# Altium footprint library ICL_komponenty_v1.PcbLib: 160 footprints (part 9 of 10)
Each footprint in its own frame and in the unit in brackets; x right, y up, seen from the top. Pads: shape width x height; smd on the part's side, far side on the other; paste and mask are expansions set on the pad; w line width, h text height; cw(c..) or ccw(c..) is an arc to the next point about the centre after c.
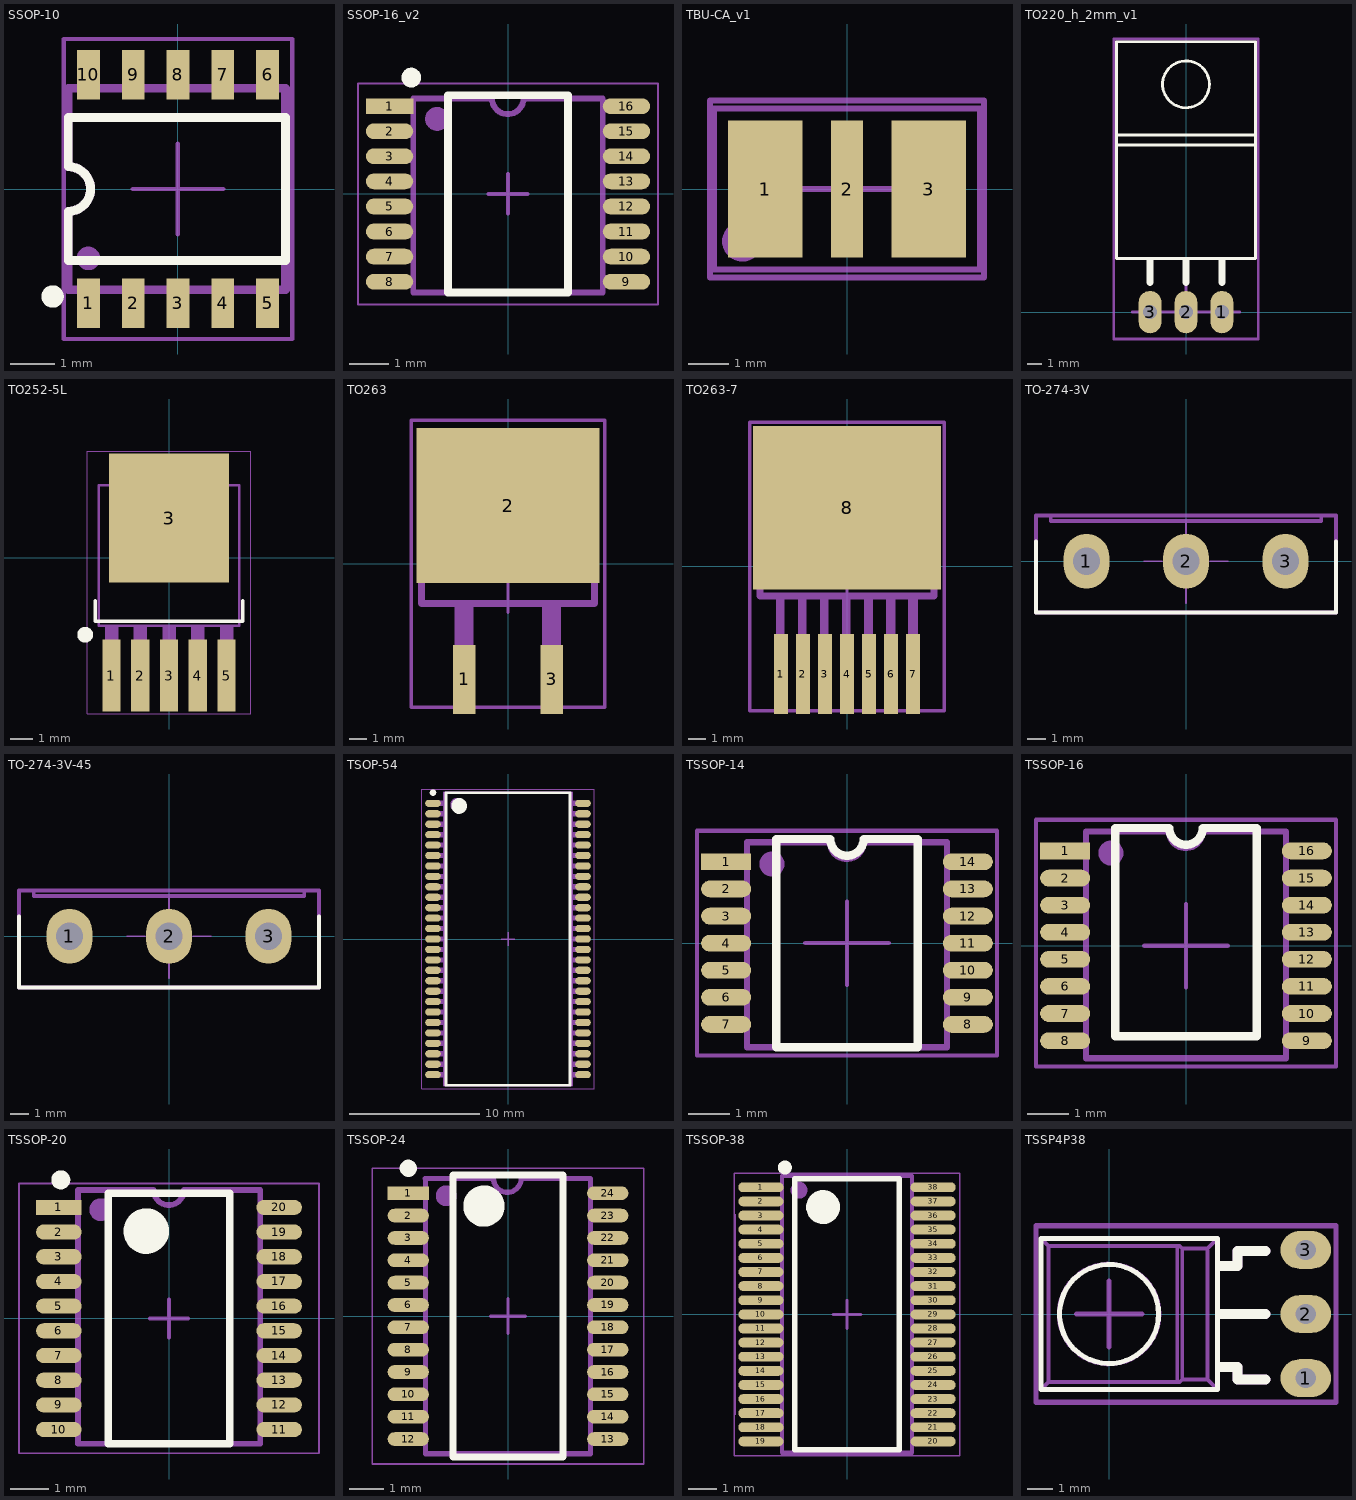
[diagram p8: the footprints below, top view; thin cyan lines are the x and y axes]

## SSOP-10 [mm] "st viper 11 series"
pads (10):
  rect 0.51x1.1 smd: 1(-2,-2.55) 2(-1,-2.55) 3(0,-2.55) 4(1,-2.55) 5(2,-2.55) 6(2,2.55) 7(1,2.55) 8(0,2.55) 9(-1,2.55) 10(-2,2.55)
Top Overlay:
  circle w0.25: c-2.8,-2.4 r0.125
  lines w0.2: -2.45,-1.6 2.4,-1.6 2.4,1.6 -2.45,1.6 -2.45,0.5 cw(c-2.45,0) -2.45,-0.5 -2.45,-1.6
Top M11-12_SMOT:
  circle w0.3: c-2,-1.55 r0.112
  region: -1.8,2.25 -1.8,3 -2.2,3 -2.2,2.25
  region: -0.8,2.25 -0.8,3 -1.2,3 -1.2,2.25
  region: 0.2,2.25 0.2,3 -0.2,3 -0.2,2.25
  region: 1.2,2.25 1.2,3 0.8,3 0.8,2.25
  region: 2.2,2.25 2.2,3 1.8,3 1.8,2.25
  region: 1.8,-2.25 1.8,-3 2.2,-3 2.2,-2.25
  region: 0.8,-2.25 0.8,-3 1.2,-3 1.2,-2.25
  region: -0.2,-2.25 -0.2,-3 0.2,-3 0.2,-2.25
  region: -1.2,-2.25 -1.2,-3 -0.8,-3 -0.8,-2.25
  region: -2.2,-2.25 -2.2,-3 -1.8,-3 -1.8,-2.25
  lines w0.2: -2.45,-2.25 2.4,-2.25 2.4,2.25 -2.45,2.25 -2.45,0.5 cw(c-2.45,0) -2.45,-0.5 -2.45,-2.25
Top M13-14_SDES:
  text "'.Designator'" at -3.965,-0.292 h0.7
Top M15-16_SORG:
  lines w0.1: -1.01,0 0,0 ; 0,-1.01 0,0 ; 0,1.01 0,0 ; 1.01,0 0,0 ; -2.55,-3.35 -2.55,3.35 2.55,3.35 2.55,-3.35 -2.55,-3.35
3D body "ssop10_viper11.step": height 1.57, standoff 0.01, extent -2.45,-3 2.45,3

## SSOP-16_v2 [mm] "smoller"
height 1.8
pads (16):
  rect 1.2x0.4 smd: 1(-3,2.222)
  oval 1.2x0.4 smd: 2(-3,1.587) 3(-3,0.953) 4(-3,0.318) 5(-3,-0.318) 6(-3,-0.953) 7(-3,-1.587) 8(-3,-2.222) 9(3,-2.222) 10(3,-1.587) 11(3,-0.953) 12(3,-0.318) 13(3,0.318) 14(3,0.953) 15(3,1.587) 16(3,2.222)
Top Overlay:
  circle w0.25: c-2.45,2.947 r0.125
  lines w0.2: -1.524,-2.5 1.524,-2.5 1.524,2.5 -1.524,2.5 -1.524,-2.5
Top M11-12_SMOT:
  circle w0.3: c-1.8,1.9 r0.15
  rectangle: -3.171,-2.387 -2.371,-2.087
  rectangle: -3.171,-1.752 -2.371,-1.452
  rectangle: -3.171,-1.117 -2.371,-0.817
  rectangle: -3.171,-0.482 -2.371,-0.182
  rectangle: -3.171,0.153 -2.371,0.453
  rectangle: -3.171,0.788 -2.371,1.088
  rectangle: -3.171,1.423 -2.371,1.723
  rectangle: -3.171,2.058 -2.371,2.358
  region: 3.171,-2.058 2.371,-2.058 2.371,-2.358 3.171,-2.358
  region: 3.171,-0.153 2.371,-0.153 2.371,-0.453 3.171,-0.453
  region: 3.171,-0.788 2.371,-0.788 2.371,-1.088 3.171,-1.088
  region: 3.171,-1.423 2.371,-1.423 2.371,-1.723 3.171,-1.723
  region: 3.171,1.752 2.371,1.752 2.371,1.452 3.171,1.452
  region: 3.171,1.117 2.371,1.117 2.371,0.817 3.171,0.817
  region: 3.171,0.482 2.371,0.482 2.371,0.182 3.171,0.182
  region: 3.171,2.387 2.371,2.387 2.371,2.087 3.171,2.087
  lines w0.15: -2.4,-2.5 -2.4,2.42 -0.407,2.42 ccw(c-0.007,2.42) 0.393,2.42 2.4,2.42 2.4,-2.5 -2.4,-2.5
Top M13-14_SDES:
  text "'.Designator'" at 0.367,-5.715 h1
Top M15-16_SORG:
  lines w0.05: -3.8,-2.8 3.8,-2.8 3.8,2.8 -3.8,2.8 -3.8,-2.8
  lines w0.1: -0.5,0 0.5,0 ; 0,-0.5 0,0.5
3D body "SSOP-16.step": height 2, standoff 0, extent -3.2,-2.5 3.2,2.5

## TBU-CA_v1 [mm] "TBU single Bourns"
pads (3):
  rect 1.85x3.4 smd: 1(-2.025,0) 3(2.025,0)
  rect 0.8x3.4 smd: 2(0,0)
Top M11-12_SMOT:
  circle w0.6: c-2.6,-1.3 r0.2
  lines w0.15: -3.3,-2 -3.3,2 3.3,2 3.3,-2 -3.3,-2
Top M13-14_SDES:
  text "'.Designator'" at -5.665,-0.417 h1
Top M15-16_SORG:
  lines w0.15: -1.4,0 0,0 ; 0,-1.4 0,0 ; 0,1.4 0,0 ; 1.4,0 0,0 ; -3.4,-2.2 3.4,-2.2 3.4,2.2 -3.4,2.2 -3.4,-2.2
3D body: height 1, standoff 0, extent -3.3,-2 3.3,2
3D body: height 1.1, standoff 1, extent -2.998,-1.8 -2.6,-1.4

## TO220_h_2mm_v1 [mm] "TO220 horizontal 2mm PCB"
pads (3):
  oval 1.6x3 hole 1: 1(2.54,0) 2(0,0) 3(-2.54,0)
Top Overlay:
  circle w0.2: c0,16.1 r1.655
  lines w0.2: -4.9,11.813 4.9,11.813 4.9,11.779 ; -4.9,12.525 4.9,12.525 ; -4.9,3.8 -4.9,19.1 4.9,19.1 4.9,3.8 -4.9,3.8
  lines w0.5: -2.54,2.1 -2.54,3.6 ; 0,2.1 0,3.6 ; 2.54,2.1 2.54,3.6
Top M15-16_SORG:
  lines w0.2: -3.8,0 0,0 ; 0,3.8 0,0 ; 3.8,0 0,0
Top M17-18_TDES:
  text "'.Designator'" at -5.465,4.883 h1
Top M19-20_TMOT:
  lines w0.2: -5.1,-1.9 5.1,-1.9 5.1,19.3 -5.1,19.3 -5.1,-1.9
3D body "TO-220LB.stp": height 4.51, standoff -3.82, extent -4.826,-0.2 4.826,19.168

## TO252-5L [mm] "XL7015E1"
height 2.39
pads (6):
  rect 0.8x3.2 smd: 1(-2.54,-5.2) 2(-1.27,-5.2) 3(0,-5.2) 4(1.27,-5.2) 5(2.54,-5.2)
  rect 5.3x5.7 smd: 3(0,1.75)
Top Overlay:
  circle w0.35: c-3.7,-3.4 r0.172
  lines w0.152: -3.25,-1.9 -3.25,-2.8 3.25,-2.8 3.25,-1.9
Top M11-12_SMOT:
  rectangle: -2.837,-5.8 -2.237,-3
  region: 2.6,3.2 2.6,4.3 -2.6,4.3 -2.6,3.2
  rectangle: -1.567,-5.8 -0.967,-3
  rectangle: -0.297,-5.8 0.303,-3
  rectangle: 0.973,-5.8 1.573,-3
  rectangle: 2.243,-5.8 2.843,-3
  lines w0.1: -3.1,-3 -3.1,3.2 3.1,3.2 3.1,-3 -3.1,-3
Top M13-14_SDES:
  text "'.Designator'" at -5.465,-8.717 h1
Top M15-16_SORG:
  lines w0.05: -3.6,-6.9 3.6,-6.9 3.6,4.7 -3.6,4.7 -3.6,-6.9
  lines w0.1: -0.5,0 0.5,0 ; 0,-0.5 0,0.5
3D body "User Library-DPAK-5-1.step": height 2.41, standoff 0.01, extent -3.35,-6.366 3.35,4.5

## TO263 [mm] "D2PACK"
pads (3):
  rect 1.3x4 smd: 1(-2.54,-6.7) 3(2.54,-6.7)
  rect 10.6x9 smd: 2(0,3.375)
Top M11-12_SMOT:
  rectangle: 1.98,-8 3.08,-2.3
  rectangle: -3.1,-8 -2,-2.3
  rectangle: -5.2,4.4 5.2,7.8
  lines w0.4: -5,-2.3 5,-2.3 5,5.8 -5,5.8 -5,-2.3
Top M13-14_SDES:
  text "'.Designator'" at -5.665,0.383 h1
Top M15-16_SORG:
  lines w0.2: -2.8,0 0,0 ; 0,-2.8 0,0 ; 0,2.8 0,0 ; 2.8,0 0,0 ; -5.6,-8.3 -5.6,8.3 5.6,8.3 5.6,-8.3 -5.6,-8.3
3D body "TO263-3S.STEP": height 4.81, standoff 0.01, extent -5,-7.99 5,7.68

## TO263-7 [mm]
pads (8):
  rect 0.8x4.6 smd: 1(-3.81,-6.2) 2(-2.54,-6.2) 3(-1.27,-6.2) 4(0,-6.2) 5(1.27,-6.2) 6(2.54,-6.2) 7(3.81,-6.2)
  rect 10.8x9.4 smd: 8(0,3.375)
Top M11-12_SMOT:
  rectangle: -5.2,5.5 5.2,7.6
  rectangle: -4.1,-6.3 -3.6,-1.7
  rectangle: -2.83,-6.3 -2.33,-1.7
  rectangle: -1.56,-6.3 -1.06,-1.7
  rectangle: -0.29,-6.3 0.21,-1.7
  rectangle: 0.98,-6.3 1.5,-1.7
  rectangle: 2.25,-6.3 2.8,-1.7
  rectangle: 3.52,-6.3 4.1,-1.7
  lines w0.4: -5,-1.7 -5,5.8 5,5.8 5,-1.7 -5,-1.7
Top M13-14_SDES:
  text "'.Designator'" at -5.665,1.783 h1
Top M15-16_SORG:
  lines w0.2: -2.8,0 0,0 ; 0,-2.8 0,0 ; 0,2.8 0,0 ; 2.8,0 0,0 ; -5.6,-8.3 5.6,-8.3 5.6,8.3 -5.6,8.3 -5.6,-8.3
3D body "TO263-7-1.STEP": height 4.81, standoff 0.01, extent -5,-7.99 5,7.68

## TO-274-3V [mm] "to-274-3V"
pads (3):
  oval 2.5x3 hole 1.5: 1(-5.44,0) 2(0,0) 3(5.44,0)
Top Overlay:
  lines w0.2: -8.2,1.1 -8.2,-2.8 8.2,-2.8 8.2,1.1
Top M15-16_SORG:
  lines w0.1: -2.3,0 -1.3,0 ; 0,-2.3 0,-1.3 ; 0,1.3 0,2.3 ; 1.3,0 2.3,0 ; -8.2,-2.8 -8.2,2.5 8.2,2.5 8.2,-2.8 -8.2,-2.8
Top M17-18_TDES:
  text "'.Designator'" at -5.665,-4.517 h1
Top M19-20_TMOT:
  lines w0.2: -7.4,2.5 -7.4,2.2 7.4,2.2 7.4,2.5 ; -8.2,-2.8 -8.2,2.5 8.2,2.5 8.2,-2.8 -8.2,-2.8
3D body "PG-TO247-3-21.step": height 25.28, standoff -15.85, extent -7.95,-2.7 7.95,2.4

## TO-274-3V-45 [mm] "to-274-3V 45 degry"
pads (3):
  oval 2.5x3 hole 1.5: 1(-5.44,0) 2(0,0) 3(5.44,0)
Top Overlay:
  lines w0.2: -8.2,1.1 -8.2,-2.8 8.2,-2.8 8.2,1.1
Top M15-16_SORG:
  lines w0.1: -2.3,0 -1.3,0 ; 0,-2.3 0,-1.3 ; 0,1.3 0,2.3 ; 1.3,0 2.3,0 ; -8.2,-2.8 8.2,-2.8 8.2,2.5 -8.2,2.5 -8.2,-2.8
Top M17-18_TDES:
  text "'.Designator'" at -5.665,-4.517 h1
Top M19-20_TMOT:
  lines w0.2: -7.4,2.5 -7.4,2.2 7.4,2.2 7.4,2.5 ; -8.2,-2.8 8.2,-2.8 8.2,2.5 -8.2,2.5 -8.2,-2.8
3D body "786901swa001_to247.stp": height 18.91, standoff -3.81, extent -7.97,-0.4 7.97,23.941

## TSOP-54 [mm] "TSOP, 54-Leads, Body 22,22x10,16mm, Pitch 0,80mm, IPC Medium Density"
height 1.2
pads (54):
  oval 1.2x0.55 smd: 1(-5.75,10.4) 2(-5.75,9.6) 3(-5.75,8.8) 4(-5.75,8) 5(-5.75,7.2) 6(-5.75,6.4) 7(-5.75,5.6) 8(-5.75,4.8) 9(-5.75,4) 10(-5.75,3.2) 11(-5.75,2.4) 12(-5.75,1.6) 13(-5.75,0.8) 14(-5.75,0) 15(-5.75,-0.8) 16(-5.75,-1.6) 17(-5.75,-2.4) 18(-5.75,-3.2) 19(-5.75,-4) 20(-5.75,-4.8) 21(-5.75,-5.6) 22(-5.75,-6.4) 23(-5.75,-7.2) 24(-5.75,-8) 25(-5.75,-8.8) 26(-5.75,-9.6) 27(-5.75,-10.4) 28(5.75,-10.4) 29(5.75,-9.6) 30(5.75,-8.8) 31(5.75,-8) 32(5.75,-7.2) 33(5.75,-6.4) 34(5.75,-5.6) 35(5.75,-4.8) 36(5.75,-4) 37(5.75,-3.2) 38(5.75,-2.4) 39(5.75,-1.6) 40(5.75,-0.8) 41(5.75,0) 42(5.75,0.8) 43(5.75,1.6) 44(5.75,2.4) 45(5.75,3.2) 46(5.75,4) 47(5.75,4.8) 48(5.75,5.6) 49(5.75,6.4) 50(5.75,7.2) 51(5.75,8) 52(5.75,8.8) 53(5.75,9.6) 54(5.75,10.4)
Top Overlay:
  circle w0.6: c-3.75,10.2 r0.3
  circle w0.25: c-5.75,11.225 r0.125
  lines w0.2: -4.75,-11.2 4.75,-11.2 4.75,11.2 -4.75,11.2 -4.75,-11.2
Top M11-12_SMOT:
  circle w0.6: c-3.9,10.3 r0.224
  region: 5.9,8.2 4.9,8.2 4.9,7.8 5.9,7.8
  region: 5.9,4.2 4.9,4.2 4.9,3.8 5.9,3.8
  region: 5.9,0.2 4.9,0.2 4.9,-0.2 5.9,-0.2
  region: 5.9,-3.8 4.9,-3.8 4.9,-4.2 5.9,-4.2
  region: 5.9,-7.8 4.9,-7.8 4.9,-8.2 5.9,-8.2
  rectangle: -5.9,7.8 -4.9,8.2
  rectangle: -5.9,-0.2 -4.9,0.2
  rectangle: -5.9,3.8 -4.9,4.2
  rectangle: -5.9,-8.2 -4.9,-7.8
  rectangle: -5.9,-4.2 -4.9,-3.8
  region: 5.9,10.6 4.9,10.6 4.9,10.2 5.9,10.2
  region: 5.9,9.8 4.9,9.8 4.9,9.4 5.9,9.4
  region: 5.9,9 4.9,9 4.9,8.6 5.9,8.6
  region: 5.9,7.4 4.9,7.4 4.9,7 5.9,7
  region: 5.9,6.6 4.9,6.6 4.9,6.2 5.9,6.2
  region: 5.9,5.8 4.9,5.8 4.9,5.4 5.9,5.4
  region: 5.9,5 4.9,5 4.9,4.6 5.9,4.6
  region: 5.9,3.4 4.9,3.4 4.9,3 5.9,3
  region: 5.9,2.6 4.9,2.6 4.9,2.2 5.9,2.2
  region: 5.9,1.8 4.9,1.8 4.9,1.4 5.9,1.4
  region: 5.9,1 4.9,1 4.9,0.6 5.9,0.6
  region: 5.9,-0.6 4.9,-0.6 4.9,-1 5.9,-1
  region: 5.9,-1.4 4.9,-1.4 4.9,-1.8 5.9,-1.8
  region: 5.9,-2.2 4.9,-2.2 4.9,-2.6 5.9,-2.6
  region: 5.9,-3 4.9,-3 4.9,-3.4 5.9,-3.4
  region: 5.9,-4.6 4.9,-4.6 4.9,-5 5.9,-5
  region: 5.9,-5.4 4.9,-5.4 4.9,-5.8 5.9,-5.8
  region: 5.9,-6.2 4.9,-6.2 4.9,-6.6 5.9,-6.6
  region: 5.9,-7 4.9,-7 4.9,-7.4 5.9,-7.4
  region: 5.9,-8.6 4.9,-8.6 4.9,-9 5.9,-9
  region: 5.9,-9.4 4.9,-9.4 4.9,-9.8 5.9,-9.8
  region: 5.9,-10.2 4.9,-10.2 4.9,-10.6 5.9,-10.6
  rectangle: -5.9,10.2 -4.9,10.6
  rectangle: -5.9,8.6 -4.9,9
  rectangle: -5.9,9.4 -4.9,9.8
  rectangle: -5.9,6.2 -4.9,6.6
  rectangle: -5.9,7 -4.9,7.4
  rectangle: -5.9,4.6 -4.9,5
  rectangle: -5.9,5.4 -4.9,5.8
  rectangle: -5.9,2.2 -4.9,2.6
  rectangle: -5.9,3 -4.9,3.4
  rectangle: -5.9,0.6 -4.9,1
  rectangle: -5.9,1.4 -4.9,1.8
  rectangle: -5.9,-1.8 -4.9,-1.4
  rectangle: -5.9,-1 -4.9,-0.6
  rectangle: -5.9,-3.4 -4.9,-3
  rectangle: -5.9,-2.6 -4.9,-2.2
  rectangle: -5.9,-5.8 -4.9,-5.4
  rectangle: -5.9,-5 -4.9,-4.6
  rectangle: -5.9,-7.4 -4.9,-7
  rectangle: -5.9,-6.6 -4.9,-6.2
  rectangle: -5.9,-9.8 -4.9,-9.4
  rectangle: -5.9,-9 -4.9,-8.6
  rectangle: -5.9,-10.6 -4.9,-10.2
  lines w0.2: -4.9,-11.2 4.9,-11.2 4.9,11.2 -4.9,11.2 -4.9,-11.2
Top M13-14_SDES:
  text "'.Designator'" at 0.583,-7.931 h1.4
Top M15-16_SORG:
  lines w0.05: -6.6,-11.5 6.6,-11.5 6.6,11.5 -6.6,11.5 -6.6,-11.5
  lines w0.1: -0.5,0 0.5,0 ; 0,-0.5 0,0.5
3D body "TSOP-54.step": height 1.2, standoff 0, extent -5.88,-11.2 5.88,11.2

## TSSOP-14 [mm]
pads (14):
  rect 1.2x0.4 smd mask+0.05: 1(-2.9,1.951)
  oval 1.2x0.4 smd mask+0.05: 2(-2.9,1.3) 3(-2.9,0.65) 4(-2.9,0) 5(-2.9,-0.65) 6(-2.9,-1.3) 7(-2.9,-1.951) 8(2.9,-1.951) 9(2.9,-1.3) 10(2.9,-0.65) 11(2.9,0) 12(2.9,0.65) 13(2.9,1.3) 14(2.9,1.951)
Top Overlay:
  lines w0.2: -1.7,-2.5 1.7,-2.5 1.7,2.5 0.4,2.5 cw(c0,2.5) -0.4,2.5 -1.7,2.5 -1.7,-2.5
Top M11-12_SMOT:
  circle w0.3: c-1.8,1.9 r0.15
  rectangle: -3.2,-0.801 -2.4,-0.501
  rectangle: -3.2,-1.451 -2.4,-1.151
  rectangle: -3.2,1.15 -2.4,1.45
  rectangle: -3.2,0.5 -2.4,0.8
  region: 3.2,-1.15 2.4,-1.15 2.4,-1.45 3.2,-1.45
  region: 3.2,-0.5 2.4,-0.5 2.4,-0.8 3.2,-0.8
  region: 3.2,0.801 2.4,0.801 2.4,0.501 3.2,0.501
  region: 3.2,1.451 2.4,1.451 2.4,1.151 3.2,1.151
  rectangle: -3.2,-2.101 -2.4,-1.801
  rectangle: -3.2,1.8 -2.4,2.1
  rectangle: -3.2,-0.151 -2.4,0.149
  region: 3.2,-1.8 2.4,-1.8 2.4,-2.1 3.2,-2.1
  region: 3.2,0.151 2.4,0.151 2.4,-0.149 3.2,-0.149
  region: 3.2,2.101 2.4,2.101 2.4,1.801 3.2,1.801
  lines w0.15: -2.4,-2.5 -2.4,2.42 -0.407,2.42 ccw(c-0.007,2.42) 0.393,2.42 2.4,2.42 2.4,-2.5 -2.4,-2.5
Top M13-14_SDES:
  text "'.Designator'" at -5.665,-0.417 h1
Top M15-16_SORG:
  lines w0.1: -1,0 0,0 ; 0,-1 0,0 ; 0,1 0,0 ; 1,0 0,0 ; -3.6,-2.7 3.6,-2.7 3.6,2.7 -3.6,2.7 -3.6,-2.7
3D body "TSSOP14.step": height 1.1, standoff 0, extent -3.2,-2.5 3.2,2.5

## TSSOP-16 [mm]
pads (16):
  rect 1.2x0.4 smd mask+0.05: 1(-2.9,2.276)
  oval 1.2x0.4 smd mask+0.05: 2(-2.9,1.625) 3(-2.9,0.975) 4(-2.9,0.325) 5(-2.9,-0.325) 6(-2.9,-0.975) 7(-2.9,-1.626) 8(-2.9,-2.276) 9(2.9,-2.276) 10(2.9,-1.626) 11(2.9,-0.975) 12(2.9,-0.325) 13(2.9,0.325) 14(2.9,0.975) 15(2.9,1.625) 16(2.9,2.276)
Top Overlay:
  lines w0.2: -1.7,-2.175 1.7,-2.175 1.7,2.825 0.4,2.825 cw(c0,2.825) -0.4,2.825 -1.7,2.825 -1.7,-2.175
Top M11-12_SMOT:
  circle w0.3: c-1.8,2.225 r0.15
  rectangle: -3.2,-0.476 -2.4,-0.176
  rectangle: -3.2,-1.126 -2.4,-0.826
  rectangle: -3.2,1.475 -2.4,1.775
  rectangle: -3.2,0.825 -2.4,1.125
  region: 3.2,-0.825 2.4,-0.825 2.4,-1.125 3.2,-1.125
  region: 3.2,-0.175 2.4,-0.175 2.4,-0.475 3.2,-0.475
  region: 3.2,1.126 2.4,1.126 2.4,0.826 3.2,0.826
  region: 3.2,1.776 2.4,1.776 2.4,1.476 3.2,1.476
  rectangle: -3.2,-1.776 -2.4,-1.476
  rectangle: -3.2,2.125 -2.4,2.425
  rectangle: -3.2,0.174 -2.4,0.474
  region: 3.2,-1.475 2.4,-1.475 2.4,-1.775 3.2,-1.775
  region: 3.2,0.476 2.4,0.476 2.4,0.176 3.2,0.176
  region: 3.2,2.426 2.4,2.426 2.4,2.126 3.2,2.126
  rectangle: -3.2,-2.427 -2.4,-2.127
  region: 3.2,-2.125 2.4,-2.125 2.4,-2.425 3.2,-2.425
  lines w0.15: -2.4,-2.7 -2.4,2.745 -0.407,2.745 ccw(c-0.007,2.745) 0.393,2.745 2.4,2.745 2.4,-2.7 -2.4,-2.7
Top M13-14_SDES:
  text "'.Designator'" at -5.665,-0.417 h1
Top M15-16_SORG:
  lines w0.1: -1,0 0,0 ; 0,-1 0,0 ; 0,1 0,0 ; 1,0 0,0 ; -3.6,-2.9 3.6,-2.9 3.6,3.025 -3.6,3.025 -3.6,-2.9
3D body "tssop16-5.step": height 1.08, standoff -0.1, extent -3.25,-2.55 3.268,2.55

## TSSOP-20 [mm]
height 1.2
pads (20):
  rect 1.2x0.4 smd: 1(-2.9,2.925)
  oval 1.2x0.4 smd: 2(-2.9,2.275) 3(-2.9,1.625) 4(-2.9,0.975) 5(-2.9,0.325) 6(-2.9,-0.325) 7(-2.9,-0.975) 8(-2.9,-1.625) 9(-2.9,-2.275) 10(-2.9,-2.925) 11(2.9,-2.925) 12(2.9,-2.275) 13(2.9,-1.625) 14(2.9,-0.975) 15(2.9,-0.325) 16(2.9,0.325) 17(2.9,0.975) 18(2.9,1.625) 19(2.9,2.275) 20(2.9,2.925)
Top Overlay:
  circle w0.6: c-0.6,2.3 r0.3
  circle w0.25: c-2.85,3.65 r0.125
  lines w0.2: -1.6,-3.3 1.6,-3.3 1.6,3.3 -1.6,3.3 -1.6,-3.3
Top M11-12_SMOT:
  circle w0.3: c-1.799,2.866 r0.15
  rectangle: -3.199,-2.435 -2.399,-2.135
  rectangle: -3.199,-3.086 -2.399,-2.786
  rectangle: -3.199,-0.485 -2.399,-0.185
  rectangle: -3.199,-1.136 -2.399,-0.836
  rectangle: -3.199,-1.785 -2.399,-1.485
  rectangle: -3.199,1.465 -2.399,1.765
  rectangle: -3.199,0.815 -2.399,1.115
  rectangle: -3.199,0.165 -2.399,0.465
  rectangle: -3.199,2.766 -2.399,3.066
  rectangle: -3.199,2.116 -2.399,2.416
  region: 3.201,-2.784 2.401,-2.784 2.401,-3.084 3.201,-3.084
  region: 3.201,-2.134 2.401,-2.134 2.401,-2.434 3.201,-2.434
  region: 3.201,-0.834 2.401,-0.834 2.401,-1.134 3.201,-1.134
  region: 3.201,-0.184 2.401,-0.184 2.401,-0.484 3.201,-0.484
  region: 3.201,-1.484 2.401,-1.484 2.401,-1.784 3.201,-1.784
  region: 3.201,0.466 2.401,0.466 2.401,0.166 3.201,0.166
  region: 3.201,1.116 2.401,1.116 2.401,0.816 3.201,0.816
  region: 3.201,1.767 2.401,1.767 2.401,1.467 3.201,1.467
  region: 3.201,2.417 2.401,2.417 2.401,2.117 3.201,2.117
  region: 3.201,3.067 2.401,3.067 2.401,2.767 3.201,2.767
  lines w0.15: -2.399,-3.3 -2.399,3.386 -0.406,3.386 ccw(c-0.006,3.386) 0.394,3.386 2.401,3.386 2.401,-3.3 -2.399,-3.3
Top M13-14_SDES:
  text "'.Designator'" at 0.367,-5.665 h1
Top M15-16_SORG:
  lines w0.05: -3.95,-3.55 3.95,-3.55 3.95,3.55 -3.95,3.55 -3.95,-3.55
  lines w0.1: -0.5,0 0.5,0 ; 0,-0.5 0,0.5
3D body "TSSOP-20.step": height 1.21, standoff 0.01, extent -3.275,-3.3 3.275,3.3

## TSSOP-24 [mm]
height 1.2
pads (24):
  rect 1.2x0.4 smd: 1(-2.9,3.575)
  oval 1.2x0.4 smd: 2(-2.9,2.925) 3(-2.9,2.275) 4(-2.9,1.625) 5(-2.9,0.975) 6(-2.9,0.325) 7(-2.9,-0.325) 8(-2.9,-0.975) 9(-2.9,-1.625) 10(-2.9,-2.275) 11(-2.9,-2.925) 12(-2.9,-3.575) 13(2.9,-3.575) 14(2.9,-2.925) 15(2.9,-2.275) 16(2.9,-1.625) 17(2.9,-0.975) 18(2.9,-0.325) 19(2.9,0.325) 20(2.9,0.975) 21(2.9,1.625) 22(2.9,2.275) 23(2.9,2.925) 24(2.9,3.575)
Top Overlay:
  circle w0.25: c-2.9,4.3 r0.125
  circle w0.6: c-0.7,3.2 r0.3
  lines w0.2: -1.6,-4.1 -1.6,4.1 1.6,4.1 1.6,-4.1 -1.6,-4.1
Top M11-12_SMOT:
  circle w0.3: c-1.8,3.5 r0.15
  region: 3.201,3.067 2.401,3.067 2.401,2.767 3.201,2.767
  region: 3.201,2.417 2.401,2.417 2.401,2.117 3.201,2.117
  region: 3.201,1.767 2.401,1.767 2.401,1.467 3.201,1.467
  region: 3.201,1.116 2.401,1.116 2.401,0.816 3.201,0.816
  region: 3.201,0.466 2.401,0.466 2.401,0.166 3.201,0.166
  region: 3.201,-1.484 2.401,-1.484 2.401,-1.784 3.201,-1.784
  region: 3.201,-0.184 2.401,-0.184 2.401,-0.484 3.201,-0.484
  region: 3.201,-0.834 2.401,-0.834 2.401,-1.134 3.201,-1.134
  region: 3.201,-2.134 2.401,-2.134 2.401,-2.434 3.201,-2.434
  region: 3.201,-2.784 2.401,-2.784 2.401,-3.084 3.201,-3.084
  rectangle: -3.199,2.116 -2.399,2.416
  rectangle: -3.199,2.766 -2.399,3.066
  rectangle: -3.199,0.165 -2.399,0.465
  rectangle: -3.199,0.815 -2.399,1.115
  rectangle: -3.199,1.465 -2.399,1.765
  rectangle: -3.199,-1.785 -2.399,-1.485
  rectangle: -3.199,-1.136 -2.399,-0.836
  rectangle: -3.199,-0.485 -2.399,-0.185
  rectangle: -3.199,-3.086 -2.399,-2.786
  rectangle: -3.199,-2.435 -2.399,-2.135
  region: 3.201,3.717 2.401,3.717 2.401,3.417 3.201,3.417
  rectangle: -3.199,3.416 -2.399,3.716
  region: 3.201,-3.434 2.401,-3.434 2.401,-3.734 3.201,-3.734
  rectangle: -3.199,-3.736 -2.399,-3.436
  lines w0.15: -2.413,4 -0.42,4 ccw(c-0.02,4) 0.38,4 2.387,4 ; -2.399,4 -2.399,-4 2.401,-4 2.401,4
Top M13-14_SDES:
  text "'.Designator'" at 0.617,-5.365 h1
Top M15-16_SORG:
  lines w0.05: -3.95,-4.3 -3.95,4.3 3.95,4.3 3.95,-4.3 -3.95,-4.3
  lines w0.1: -0.5,0 0.5,0 ; 0,-0.5 0,0.5
3D body "TSSOP24_v001.step": height 1.2, standoff 0, extent -3.278,-3.95 3.278,3.95

## TSSOP-38 [mm] "TSSOP, 38-Leads, Body 9.70x4.40mm, Pitch 0.50mm, IPC Low Density"
height 1.2
pads (38):
  oval 1.6x0.35 smd: 1(-3.05,4.5) 2(-3.05,4) 3(-3.05,3.5) 4(-3.05,3) 5(-3.05,2.5) 6(-3.05,2) 7(-3.05,1.5) 8(-3.05,1) 9(-3.05,0.5) 10(-3.05,0) 11(-3.05,-0.5) 12(-3.05,-1) 13(-3.05,-1.5) 14(-3.05,-2) 15(-3.05,-2.5) 16(-3.05,-3) 17(-3.05,-3.5) 18(-3.05,-4) 19(-3.05,-4.5) 20(3.05,-4.5) 21(3.05,-4) 22(3.05,-3.5) 23(3.05,-3) 24(3.05,-2.5) 25(3.05,-2) 26(3.05,-1.5) 27(3.05,-1) 28(3.05,-0.5) 29(3.05,0) 30(3.05,0.5) 31(3.05,1) 32(3.05,1.5) 33(3.05,2) 34(3.05,2.5) 35(3.05,3) 36(3.05,3.5) 37(3.05,4) 38(3.05,4.5)
Top Overlay:
  circle w0.25: c-2.2,5.2 r0.125
  circle w0.6: c-0.85,3.8 r0.3
  lines w0.2: -1.85,-4.8 -1.85,4.8 1.85,4.8 1.85,-4.8 -1.85,-4.8
Top M11-12_SMOT:
  circle w0.3: c-1.7,4.4 r0.15
  region: 3.2,4.614 2.3,4.614 2.3,4.4 3.2,4.4
  region: 3.2,4.114 2.3,4.114 2.3,3.9 3.2,3.9
  region: 3.2,3.614 2.3,3.614 2.3,3.4 3.2,3.4
  region: 3.2,3.114 2.3,3.114 2.3,2.9 3.2,2.9
  region: 3.2,2.614 2.3,2.614 2.3,2.4 3.2,2.4
  region: 3.2,2.114 2.3,2.114 2.3,1.9 3.2,1.9
  region: 3.2,1.614 2.3,1.614 2.3,1.4 3.2,1.4
  region: 3.2,1.114 2.3,1.114 2.3,0.9 3.2,0.9
  region: 3.2,0.614 2.3,0.614 2.3,0.4 3.2,0.4
  region: 3.2,0.114 2.3,0.114 2.3,-0.1 3.2,-0.1
  region: 3.2,-0.386 2.3,-0.386 2.3,-0.6 3.2,-0.6
  region: 3.2,-0.886 2.3,-0.886 2.3,-1.1 3.2,-1.1
  region: 3.2,-1.386 2.3,-1.386 2.3,-1.6 3.2,-1.6
  region: 3.2,-1.886 2.3,-1.886 2.3,-2.1 3.2,-2.1
  region: 3.2,-2.386 2.3,-2.386 2.3,-2.6 3.2,-2.6
  region: 3.2,-2.886 2.3,-2.886 2.3,-3.1 3.2,-3.1
  region: 3.2,-3.386 2.3,-3.386 2.3,-3.6 3.2,-3.6
  region: 3.2,-3.886 2.3,-3.886 2.3,-4.1 3.2,-4.1
  region: 3.2,-4.386 2.3,-4.386 2.3,-4.6 3.2,-4.6
  rectangle: -3.2,-4.614 -2.3,-4.4
  rectangle: -3.2,-4.114 -2.3,-3.9
  rectangle: -3.2,-3.614 -2.3,-3.4
  rectangle: -3.2,-3.114 -2.3,-2.9
  rectangle: -3.2,-2.614 -2.3,-2.4
  rectangle: -3.2,-2.114 -2.3,-1.9
  rectangle: -3.2,-1.614 -2.3,-1.4
  rectangle: -3.2,-1.114 -2.3,-0.9
  rectangle: -3.2,-0.614 -2.3,-0.4
  rectangle: -3.2,-0.114 -2.3,0.1
  rectangle: -3.2,0.386 -2.3,0.6
  rectangle: -3.2,0.886 -2.3,1.1
  rectangle: -3.2,1.386 -2.3,1.6
  rectangle: -3.2,1.886 -2.3,2.1
  rectangle: -3.2,2.386 -2.3,2.6
  rectangle: -3.2,2.886 -2.3,3.1
  rectangle: -3.2,3.386 -2.3,3.6
  rectangle: -3.2,3.886 -2.3,4.1
  rectangle: -3.2,4.386 -2.3,4.6
  lines w0.15: -2.3,-4.9 2.3,-4.9 2.3,4.9 -2.3,4.9 -2.3,-4.9
Top M13-14_SDES:
  text "'.Designator'" at 0.367,-5.665 h1
Top M15-16_SORG:
  lines w0.05: -3.95,-3.55 -3.95,3.55 ; -4,-5 -4,5 4,5 4,-5 -4,-5
  lines w0.1: -0.5,0 0.5,0 ; 0,-0.5 0,0.5
3D body "TSSOP-38.step": height 1.2, standoff 0, extent -3.2,-4.8 3.2,4.8

## TSSP4P38 [mm] "Vishay"
pads (3):
  oval 2x1.5 hole 0.8: 1(7.8,-2.54) 2(7.8,0) 3(7.8,2.54)
Top Overlay:
  circle w0.2: c0,0 r1.965
  lines w0.2: -2.7,-3 -2.7,3 4.3,3 4.3,-3 -2.7,-3
  lines w0.4: 4.4,-2.1 5.1,-2.1 5.1,-2.6 6.2,-2.6 ; 4.4,0 6.2,0 ; 4.4,1.9 5.1,1.9 5.1,2.5 6.2,2.5
Top M17-18_TDES:
  text "'.Designator'" at -3.265,1.983 h1
Top M19-20_TMOT:
  circle w0.15: c0,0 r2
  lines w0.15: 2.898,2.599 2.797,2.7 2.7,2.7 ; 2.901,-2.599 2.8,-2.7 2.7,-2.7 ; 3.9,2.5 3.9,-2.6 ; -2.7,-3 -2.7,3 ; -2.7,-3 4.3,-3 ; -2.7,-3 -2.4,-2.7 ; -2.7,3 4.3,3 ; -2.7,3 -2.4,2.7 ; -2.4,-2.7 -2.4,2.7 ; -2.4,-2.7 2.7,-2.7 ; -2.4,2.7 2.7,2.7 ; 2.7,-2.7 2.7,2.7 ; 3.9,-2.6 4.3,-3 ; 3.9,-2.6 2.902,-2.6 2.899,2.6 3.9,2.6 4.3,3 ; 4.3,-3 4.3,3
  lines w0.4: 4.4,1.9 5.1,1.9 5.1,2.5 6.2,2.5 ; 4.5,-2.1 5.1,-2.1 5.1,-2.6 6.2,-2.6 ; 4.5,0 6.2,0
Top M25-26_TORG:
  lines w0.2: -1.3,0 0,0 ; 0,-1.3 0,0 ; 0,1.3 0,0 ; 1.3,0 0,0 ; -2.9,-3.5 9,-3.5 9,3.5 -2.9,3.5 -2.9,-3.5
3D body "TSSP4P38.stp": height 5.56, standoff 0.01, extent -2.7,-3 6.9,3